# Altium schematic symbol library jlcpcb_2025_04_capacitors_extended_1210.schlib: 709 symbols (part 3 of 4) (continued)
## FM32X223K501ECG
designator C?  Capacitance: 22nF  (hidden comment: *)
Capacitor, Ceramic (MLCC), 22nF, ±10%, 500V, ±10%, SMD 1210; Manufacturer: PSA(Prosperity Dielectrics); Manufacturer Part Number: FM32X223K501ECG; Package Size: 1210; JLCPCB Basic Part: No; JLCPCB Part Number: C976242; Supplier 1: LCSC; Category: Capacitors - MLCC; Supplier Part Number 1: C976242; Tolerance: ±10%; Voltage Rating: 500V; RoHS: Yes; ComponentLink1Description: Datasheet; ComponentLink1URL: https://wmsc.lcsc.com/wmsc/upload/file/pdf/v2/lcsc/2012171208_PSA-Prosperity-Dielectrics-FM32X223K501ECG_C976242.pdf; ComponentLink2Description: JLCPCB Part URL; ComponentLink2URL: https://jlcpcb.com/partdetail/C976242; ComponentLink3Description: LCSC Part URL; ComponentLink3URL: https://lcsc.com/product-detail/Multilayer-Ceramic-Capacitors-MLCC---SMD-SMT_PSAProsperity-Dielectrics-PSAProsperity-Dielectrics-FM32X223K501ECG_C976242.html
footprint CAP-1210 (1210 (3225M) Capacitor)
pins: 1, 2

## FM32X223K501EEG
designator C?  Capacitance: 22nF  (hidden comment: *)
Capacitor, Ceramic (MLCC), 22nF, ±10%, 500V, X7R, ±10%, SMD 1210; Manufacturer: PSA(Prosperity Dielectrics); Manufacturer Part Number: FM32X223K501EEG; Package Size: 1210; JLCPCB Basic Part: No; JLCPCB Part Number: C382221; Supplier 1: LCSC; Category: Capacitors - MLCC; Supplier Part Number 1: C382221; Tolerance: ±10%; Voltage Rating: 500V; Temperature Coefficient: X7R; RoHS: Yes; ComponentLink1Description: Datasheet; ComponentLink1URL: https://wmsc.lcsc.com/wmsc/upload/file/pdf/v2/lcsc/2304140030_PSA-Prosperity-Dielectrics-FM32X223K501EEG_C382221.pdf; ComponentLink2Description: JLCPCB Part URL; ComponentLink2URL: https://jlcpcb.com/partdetail/C382221; ComponentLink3Description: LCSC Part URL; ComponentLink3URL: https://lcsc.com/product-detail/Multilayer-Ceramic-Capacitors-MLCC---SMD-SMT_PSAProsperity-Dielectrics-PSAProsperity-Dielectrics-FM32X223K501EEG_C382221.html
footprint CAP-1210 (1210 (3225M) Capacitor)
pins: 1, 2

## FM32X223K631ECG
designator C?  Capacitance: 22nF  (hidden comment: *)
Capacitor, Ceramic (MLCC), 22nF, ±10%, 630V, X7R, ±10%, SMD 1210; Manufacturer: PSA(Prosperity Dielectrics); Manufacturer Part Number: FM32X223K631ECG; Package Size: 1210; JLCPCB Basic Part: No; JLCPCB Part Number: C692286; Supplier 1: LCSC; Category: Capacitors - MLCC; Supplier Part Number 1: C692286; Tolerance: ±10%; Voltage Rating: 630V; Temperature Coefficient: X7R; RoHS: Yes; ComponentLink1Description: Datasheet; ComponentLink1URL: https://wmsc.lcsc.com/wmsc/upload/file/pdf/v2/lcsc/2304140030_PSA-Prosperity-Dielectrics-FM32X223K631ECG_C692286.pdf; ComponentLink2Description: JLCPCB Part URL; ComponentLink2URL: https://jlcpcb.com/partdetail/C692286; ComponentLink3Description: LCSC Part URL; ComponentLink3URL: https://lcsc.com/product-detail/Multilayer-Ceramic-Capacitors-MLCC---SMD-SMT_PSAProsperity-Dielectrics-PSAProsperity-Dielectrics-FM32X223K631ECG_C692286.html
footprint CAP-1210 (1210 (3225M) Capacitor)
pins: 1, 2

## FM32X223M501ECG
designator C?  Capacitance: 22nF  (hidden comment: *)
Capacitor, Ceramic (MLCC), 22nF, 500V, X7R, SMD 1210; Manufacturer: PSA(Prosperity Dielectrics); Manufacturer Part Number: FM32X223M501ECG; Package Size: 1210; JLCPCB Basic Part: No; JLCPCB Part Number: C2929696; Supplier 1: LCSC; Category: Capacitors - MLCC; Supplier Part Number 1: C2929696; Voltage Rating: 500V; Temperature Coefficient: X7R; RoHS: Yes; ComponentLink1Description: Datasheet; ComponentLink1URL: https://wmsc.lcsc.com/wmsc/upload/file/pdf/v2/lcsc/2203101903_PSA-Prosperity-Dielectrics-FM32X223M501ECG_C2929696.pdf; ComponentLink2Description: JLCPCB Part URL; ComponentLink2URL: https://jlcpcb.com/partdetail/C2929696; ComponentLink3Description: LCSC Part URL; ComponentLink3URL: https://lcsc.com/product-detail/Multilayer-Ceramic-Capacitors-MLCC---SMD-SMT_PSAProsperity-Dielectrics-PSAProsperity-Dielectrics-FM32X223M501ECG_C2929696.html
footprint CAP-1210 (1210 (3225M) Capacitor)
pins: 1, 2

## FM32X224K101ECG
designator C?  Capacitance: 220nF  (hidden comment: *)
Capacitor, Ceramic (MLCC), 220nF, ±10%, 100V, X7R, ±10%, SMD 1210; Manufacturer: PSA(Prosperity Dielectrics); Manufacturer Part Number: FM32X224K101ECG; Package Size: 1210; JLCPCB Basic Part: No; JLCPCB Part Number: C363568; Supplier 1: LCSC; Category: Capacitors - MLCC; Supplier Part Number 1: C363568; Tolerance: ±10%; Voltage Rating: 100V; Temperature Coefficient: X7R; RoHS: Yes; ComponentLink1Description: Datasheet; ComponentLink1URL: https://wmsc.lcsc.com/wmsc/upload/file/pdf/v2/lcsc/2304140030_PSA-Prosperity-Dielectrics-FM32X224K101ECG_C363568.pdf; ComponentLink2Description: JLCPCB Part URL; ComponentLink2URL: https://jlcpcb.com/partdetail/C363568; ComponentLink3Description: LCSC Part URL; ComponentLink3URL: https://lcsc.com/product-detail/Multilayer-Ceramic-Capacitors-MLCC---SMD-SMT_PSAProsperity-Dielectrics-PSAProsperity-Dielectrics-FM32X224K101ECG_C363568.html
footprint CAP-1210 (1210 (3225M) Capacitor)
pins: 1, 2

## FM32X224K251EEG
designator C?  Capacitance: 220nF  (hidden comment: *)
Capacitor, Ceramic (MLCC), 220nF, ±10%, 250V, X7R, ±10%, SMD 1210; Manufacturer: PSA(Prosperity Dielectrics); Manufacturer Part Number: FM32X224K251EEG; Package Size: 1210; JLCPCB Basic Part: No; JLCPCB Part Number: C146177; Supplier 1: LCSC; Category: Capacitors - MLCC; Supplier Part Number 1: C146177; Tolerance: ±10%; Voltage Rating: 250V; Temperature Coefficient: X7R; RoHS: Yes; ComponentLink1Description: Datasheet; ComponentLink1URL: https://wmsc.lcsc.com/wmsc/upload/file/pdf/v2/lcsc/2304140030_PSA-Prosperity-Dielectrics-FM32X224K251EEG_C146177.pdf; ComponentLink2Description: JLCPCB Part URL; ComponentLink2URL: https://jlcpcb.com/partdetail/C146177; ComponentLink3Description: LCSC Part URL; ComponentLink3URL: https://lcsc.com/product-detail/Multilayer-Ceramic-Capacitors-MLCC---SMD-SMT_PSAProsperity-Dielectrics-PSAProsperity-Dielectrics-FM32X224K251EEG_C146177.html
footprint CAP-1210 (1210 (3225M) Capacitor)
pins: 1, 2

## FM32X224K251EGG
designator C?  Capacitance: 220nF  (hidden comment: *)
Capacitor, Ceramic (MLCC), 220nF, ±10%, 250V, ±10%, SMD 1210; Manufacturer: PSA(Prosperity Dielectrics); Manufacturer Part Number: FM32X224K251EGG; Package Size: 1210; JLCPCB Basic Part: No; JLCPCB Part Number: C2843408; Supplier 1: LCSC; Category: Capacitors - MLCC; Supplier Part Number 1: C2843408; Tolerance: ±10%; Voltage Rating: 250V; RoHS: Yes; ComponentLink1Description: Datasheet; ComponentLink1URL: https://wmsc.lcsc.com/wmsc/upload/file/pdf/v2/lcsc/2108072030_PSA-Prosperity-Dielectrics-FM32X224K251EGG_C2843408.pdf; ComponentLink2Description: JLCPCB Part URL; ComponentLink2URL: https://jlcpcb.com/partdetail/C2843408; ComponentLink3Description: LCSC Part URL; ComponentLink3URL: https://lcsc.com/product-detail/Multilayer-Ceramic-Capacitors-MLCC---SMD-SMT_PSAProsperity-Dielectrics-PSAProsperity-Dielectrics-FM32X224K251EGG_C2843408.html
footprint CAP-1210 (1210 (3225M) Capacitor)
pins: 1, 2

## FM32X273K101EMG
designator C?  Capacitance: 27nF  (hidden comment: *)
Capacitor, Ceramic (MLCC), 27nF, ±10%, 100V, X7R, ±10%, SMD 1210; Manufacturer: PSA(Prosperity Dielectrics); Manufacturer Part Number: FM32X273K101EMG; Package Size: 1210; JLCPCB Basic Part: No; JLCPCB Part Number: C525188; Supplier 1: LCSC; Category: Capacitors - MLCC; Supplier Part Number 1: C525188; Tolerance: ±10%; Voltage Rating: 100V; Temperature Coefficient: X7R; RoHS: Yes; ComponentLink1Description: Datasheet; ComponentLink1URL: https://wmsc.lcsc.com/wmsc/upload/file/pdf/v2/lcsc/2304140030_PSA-Prosperity-Dielectrics-FM32X273K101EMG_C525188.pdf; ComponentLink2Description: JLCPCB Part URL; ComponentLink2URL: https://jlcpcb.com/partdetail/C525188; ComponentLink3Description: LCSC Part URL; ComponentLink3URL: https://lcsc.com/product-detail/Multilayer-Ceramic-Capacitors-MLCC---SMD-SMT_PSAProsperity-Dielectrics-PSAProsperity-Dielectrics-FM32X273K101EMG_C525188.html
footprint CAP-1210 (1210 (3225M) Capacitor)
pins: 1, 2

## FM32X333K631EEG
designator C?  Capacitance: 33nF  (hidden comment: *)
Capacitor, Ceramic (MLCC), 33nF, ±10%, 630V, X7R, ±10%, SMD 1210; Manufacturer: PSA(Prosperity Dielectrics); Manufacturer Part Number: FM32X333K631EEG; Package Size: 1210; JLCPCB Basic Part: No; JLCPCB Part Number: C382220; Supplier 1: LCSC; Category: Capacitors - MLCC; Supplier Part Number 1: C382220; Tolerance: ±10%; Voltage Rating: 630V; Temperature Coefficient: X7R; RoHS: Yes; ComponentLink1Description: Datasheet; ComponentLink1URL: https://wmsc.lcsc.com/wmsc/upload/file/pdf/v2/lcsc/2304140030_PSA-Prosperity-Dielectrics-FM32X333K631EEG_C382220.pdf; ComponentLink2Description: JLCPCB Part URL; ComponentLink2URL: https://jlcpcb.com/partdetail/C382220; ComponentLink3Description: LCSC Part URL; ComponentLink3URL: https://lcsc.com/product-detail/Multilayer-Ceramic-Capacitors-MLCC---SMD-SMT_PSAProsperity-Dielectrics-PSAProsperity-Dielectrics-FM32X333K631EEG_C382220.html
footprint CAP-1210 (1210 (3225M) Capacitor)
pins: 1, 2

## FM32X334K101EEG
designator C?  Capacitance: 330nF  (hidden comment: *)
Capacitor, Ceramic (MLCC), 330nF, 100V, X7R, SMD 1210; Manufacturer: PSA(Prosperity Dielectrics); Manufacturer Part Number: FM32X334K101EEG; Package Size: 1210; JLCPCB Basic Part: No; JLCPCB Part Number: C2915731; Supplier 1: LCSC; Category: Capacitors - MLCC; Supplier Part Number 1: C2915731; Voltage Rating: 100V; Temperature Coefficient: X7R; RoHS: Yes; ComponentLink1Description: Datasheet; ComponentLink1URL: https://wmsc.lcsc.com/wmsc/upload/file/pdf/v2/lcsc/2111161830_PSA-Prosperity-Dielectrics-FM32X334K101EEG_C2915731.pdf; ComponentLink2Description: JLCPCB Part URL; ComponentLink2URL: https://jlcpcb.com/partdetail/C2915731; ComponentLink3Description: LCSC Part URL; ComponentLink3URL: https://lcsc.com/product-detail/Multilayer-Ceramic-Capacitors-MLCC---SMD-SMT_PSAProsperity-Dielectrics-PSAProsperity-Dielectrics-FM32X334K101EEG_C2915731.html
footprint CAP-1210 (1210 (3225M) Capacitor)
pins: 1, 2

## FM32X473K251ECG
designator C?  Capacitance: 47nF  (hidden comment: *)
Capacitor, Ceramic (MLCC), 47nF, ±10%, 250V, X7R, ±10%, SMD 1210; Manufacturer: PSA(Prosperity Dielectrics); Manufacturer Part Number: FM32X473K251ECG; Package Size: 1210; JLCPCB Basic Part: No; JLCPCB Part Number: C779501; Supplier 1: LCSC; Category: Capacitors - MLCC; Supplier Part Number 1: C779501; Tolerance: ±10%; Voltage Rating: 250V; Temperature Coefficient: X7R; RoHS: Yes; ComponentLink1Description: Datasheet; ComponentLink1URL: https://wmsc.lcsc.com/wmsc/upload/file/pdf/v2/lcsc/2009031038_PSA-Prosperity-Dielectrics-FM32X473K251ECG_C779501.pdf; ComponentLink2Description: JLCPCB Part URL; ComponentLink2URL: https://jlcpcb.com/partdetail/C779501; ComponentLink3Description: LCSC Part URL; ComponentLink3URL: https://lcsc.com/product-detail/Multilayer-Ceramic-Capacitors-MLCC---SMD-SMT_PSAProsperity-Dielectrics-PSAProsperity-Dielectrics-FM32X473K251ECG_C779501.html
footprint CAP-1210 (1210 (3225M) Capacitor)
pins: 1, 2

## FM32X473K631EEG
designator C?  Capacitance: 47nF  (hidden comment: *)
Capacitor, Ceramic (MLCC), 47nF, ±10%, 630V, X7R, ±10%, SMD 1210; Manufacturer: PSA(Prosperity Dielectrics); Manufacturer Part Number: FM32X473K631EEG; Package Size: 1210; JLCPCB Basic Part: No; JLCPCB Part Number: C692292; Supplier 1: LCSC; Category: Capacitors - MLCC; Supplier Part Number 1: C692292; Tolerance: ±10%; Voltage Rating: 630V; Temperature Coefficient: X7R; RoHS: Yes; ComponentLink1Description: Datasheet; ComponentLink1URL: https://wmsc.lcsc.com/wmsc/upload/file/pdf/v2/lcsc/2304140030_PSA-Prosperity-Dielectrics-FM32X473K631EEG_C692292.pdf; ComponentLink2Description: JLCPCB Part URL; ComponentLink2URL: https://jlcpcb.com/partdetail/C692292; ComponentLink3Description: LCSC Part URL; ComponentLink3URL: https://lcsc.com/product-detail/Multilayer-Ceramic-Capacitors-MLCC---SMD-SMT_PSAProsperity-Dielectrics-PSAProsperity-Dielectrics-FM32X473K631EEG_C692292.html
footprint CAP-1210 (1210 (3225M) Capacitor)
pins: 1, 2

## FM32X474K101EEG
designator C?  Capacitance: 470nF  (hidden comment: *)
Capacitor, Ceramic (MLCC), 470nF, ±10%, 100V, X7R, ±10%, SMD 1210; Manufacturer: PSA(Prosperity Dielectrics); Manufacturer Part Number: FM32X474K101EEG; Package Size: 1210; JLCPCB Basic Part: No; JLCPCB Part Number: C382219; Supplier 1: LCSC; Category: Capacitors - MLCC; Supplier Part Number 1: C382219; Tolerance: ±10%; Voltage Rating: 100V; Temperature Coefficient: X7R; RoHS: Yes; ComponentLink1Description: Datasheet; ComponentLink1URL: https://wmsc.lcsc.com/wmsc/upload/file/pdf/v2/lcsc/2304140030_PSA-Prosperity-Dielectrics-FM32X474K101EEG_C382219.pdf; ComponentLink2Description: JLCPCB Part URL; ComponentLink2URL: https://jlcpcb.com/partdetail/C382219; ComponentLink3Description: LCSC Part URL; ComponentLink3URL: https://lcsc.com/product-detail/Multilayer-Ceramic-Capacitors-MLCC---SMD-SMT_PSAProsperity-Dielectrics-PSAProsperity-Dielectrics-FM32X474K101EEG_C382219.html
footprint CAP-1210 (1210 (3225M) Capacitor)
pins: 1, 2

## FM32X474K101EGG
designator C?  Capacitance: 470nF  (hidden comment: *)
Capacitor, Ceramic (MLCC), 470nF, ±10%, 100V, X7R, ±10%, SMD 1210; Manufacturer: PSA(Prosperity Dielectrics); Manufacturer Part Number: FM32X474K101EGG; Package Size: 1210; JLCPCB Basic Part: No; JLCPCB Part Number: C2847452; Supplier 1: LCSC; Category: Capacitors - MLCC; Supplier Part Number 1: C2847452; Tolerance: ±10%; Voltage Rating: 100V; Temperature Coefficient: X7R; RoHS: Yes; ComponentLink1Description: Datasheet; ComponentLink1URL: https://wmsc.lcsc.com/wmsc/upload/file/pdf/v2/lcsc/2108142230_PSA-Prosperity-Dielectrics-FM32X474K101EGG_C2847452.pdf; ComponentLink2Description: JLCPCB Part URL; ComponentLink2URL: https://jlcpcb.com/partdetail/C2847452; ComponentLink3Description: LCSC Part URL; ComponentLink3URL: https://lcsc.com/product-detail/Multilayer-Ceramic-Capacitors-MLCC---SMD-SMT_PSAProsperity-Dielectrics-PSAProsperity-Dielectrics-FM32X474K101EGG_C2847452.html
footprint CAP-1210 (1210 (3225M) Capacitor)
pins: 1, 2

## FM32X474K201EGG
designator C?  Capacitance: 470nF  (hidden comment: *)
Capacitor, Ceramic (MLCC), 470nF, ±10%, 200V, X7R, ±10%, SMD 1210; Manufacturer: PSA(Prosperity Dielectrics); Manufacturer Part Number: FM32X474K201EGG; Package Size: 1210; JLCPCB Basic Part: No; JLCPCB Part Number: C394156; Supplier 1: LCSC; Category: Capacitors - MLCC; Supplier Part Number 1: C394156; Tolerance: ±10%; Voltage Rating: 200V; Temperature Coefficient: X7R; RoHS: Yes; ComponentLink1Description: Datasheet; ComponentLink1URL: https://wmsc.lcsc.com/wmsc/upload/file/pdf/v2/lcsc/2304140030_PSA-Prosperity-Dielectrics-FM32X474K201EGG_C394156.pdf; ComponentLink2Description: JLCPCB Part URL; ComponentLink2URL: https://jlcpcb.com/partdetail/C394156; ComponentLink3Description: LCSC Part URL; ComponentLink3URL: https://lcsc.com/product-detail/Multilayer-Ceramic-Capacitors-MLCC---SMD-SMT_PSAProsperity-Dielectrics-PSAProsperity-Dielectrics-FM32X474K201EGG_C394156.html
footprint CAP-1210 (1210 (3225M) Capacitor)
pins: 1, 2

## FM32X474K251EGG
designator C?  Capacitance: 470nF  (hidden comment: *)
Capacitor, Ceramic (MLCC), 470nF, ±10%, 250V, X7R, ±10%, SMD 1210; Manufacturer: PSA(Prosperity Dielectrics); Manufacturer Part Number: FM32X474K251EGG; Package Size: 1210; JLCPCB Basic Part: No; JLCPCB Part Number: C192761; Supplier 1: LCSC; Category: Capacitors - MLCC; Supplier Part Number 1: C192761; Tolerance: ±10%; Voltage Rating: 250V; Temperature Coefficient: X7R; RoHS: Yes; ComponentLink1Description: Datasheet; ComponentLink1URL: https://wmsc.lcsc.com/wmsc/upload/file/pdf/v2/lcsc/2304140030_PSA-Prosperity-Dielectrics-FM32X474K251EGG_C192761.pdf; ComponentLink2Description: JLCPCB Part URL; ComponentLink2URL: https://jlcpcb.com/partdetail/C192761; ComponentLink3Description: LCSC Part URL; ComponentLink3URL: https://lcsc.com/product-detail/Multilayer-Ceramic-Capacitors-MLCC---SMD-SMT_PSAProsperity-Dielectrics-PSAProsperity-Dielectrics-FM32X474K251EGG_C192761.html
footprint CAP-1210 (1210 (3225M) Capacitor)
pins: 1, 2

## FM32X563K631EEG
designator C?  Capacitance: 56nF  (hidden comment: *)
Capacitor, Ceramic (MLCC), 56nF, ±10%, 630V, X7R, ±10%, SMD 1210; Manufacturer: PSA(Prosperity Dielectrics); Manufacturer Part Number: FM32X563K631EEG; Package Size: 1210; JLCPCB Basic Part: No; JLCPCB Part Number: C382218; Supplier 1: LCSC; Category: Capacitors - MLCC; Supplier Part Number 1: C382218; Tolerance: ±10%; Voltage Rating: 630V; Temperature Coefficient: X7R; RoHS: Yes; ComponentLink1Description: Datasheet; ComponentLink1URL: https://wmsc.lcsc.com/wmsc/upload/file/pdf/v2/lcsc/2304140030_PSA-Prosperity-Dielectrics-FM32X563K631EEG_C382218.pdf; ComponentLink2Description: JLCPCB Part URL; ComponentLink2URL: https://jlcpcb.com/partdetail/C382218; ComponentLink3Description: LCSC Part URL; ComponentLink3URL: https://lcsc.com/product-detail/Multilayer-Ceramic-Capacitors-MLCC---SMD-SMT_PSAProsperity-Dielectrics-PSAProsperity-Dielectrics-FM32X563K631EEG_C382218.html
footprint CAP-1210 (1210 (3225M) Capacitor)
pins: 1, 2

## FM32X683K501EFG
designator C?  Capacitance: 68nF  (hidden comment: *)
Capacitor, Ceramic (MLCC), 68nF, ±10%, 500V, X7R, ±10%, SMD 1210; Manufacturer: PSA(Prosperity Dielectrics); Manufacturer Part Number: FM32X683K501EFG; Package Size: 1210; JLCPCB Basic Part: No; JLCPCB Part Number: C146178; Supplier 1: LCSC; Category: Capacitors - MLCC; Supplier Part Number 1: C146178; Tolerance: ±10%; Voltage Rating: 500V; Temperature Coefficient: X7R; RoHS: Yes; ComponentLink1Description: Datasheet; ComponentLink1URL: https://wmsc.lcsc.com/wmsc/upload/file/pdf/v2/lcsc/2304140030_PSA-Prosperity-Dielectrics-FM32X683K501EFG_C146178.pdf; ComponentLink2Description: JLCPCB Part URL; ComponentLink2URL: https://jlcpcb.com/partdetail/C146178; ComponentLink3Description: LCSC Part URL; ComponentLink3URL: https://lcsc.com/product-detail/Multilayer-Ceramic-Capacitors-MLCC---SMD-SMT_PSAProsperity-Dielectrics-PSAProsperity-Dielectrics-FM32X683K501EFG_C146178.html
footprint CAP-1210 (1210 (3225M) Capacitor)
pins: 1, 2

## FM32X683K631EFG
designator C?  Capacitance: 68nF  (hidden comment: *)
Capacitor, Ceramic (MLCC), 68nF, ±10%, 630V, X7R, ±10%, SMD 1210; Manufacturer: PSA(Prosperity Dielectrics); Manufacturer Part Number: FM32X683K631EFG; Package Size: 1210; JLCPCB Basic Part: No; JLCPCB Part Number: C692293; Supplier 1: LCSC; Category: Capacitors - MLCC; Supplier Part Number 1: C692293; Tolerance: ±10%; Voltage Rating: 630V; Temperature Coefficient: X7R; RoHS: Yes; ComponentLink1Description: Datasheet; ComponentLink1URL: https://wmsc.lcsc.com/wmsc/upload/file/pdf/v2/lcsc/2304140030_PSA-Prosperity-Dielectrics-FM32X683K631EFG_C692293.pdf; ComponentLink2Description: JLCPCB Part URL; ComponentLink2URL: https://jlcpcb.com/partdetail/C692293; ComponentLink3Description: LCSC Part URL; ComponentLink3URL: https://lcsc.com/product-detail/Multilayer-Ceramic-Capacitors-MLCC---SMD-SMT_PSAProsperity-Dielectrics-PSAProsperity-Dielectrics-FM32X683K631EFG_C692293.html
footprint CAP-1210 (1210 (3225M) Capacitor)
pins: 1, 2

## FM32X684K101EFG
designator C?  Capacitance: 680nF  (hidden comment: *)
Capacitor, Ceramic (MLCC), 680nF, ±10%, 100V, X7R, ±10%, SMD 1210; Manufacturer: PSA(Prosperity Dielectrics); Manufacturer Part Number: FM32X684K101EFG; Package Size: 1210; JLCPCB Basic Part: No; JLCPCB Part Number: C692308; Supplier 1: LCSC; Category: Capacitors - MLCC; Supplier Part Number 1: C692308; Tolerance: ±10%; Voltage Rating: 100V; Temperature Coefficient: X7R; RoHS: Yes; ComponentLink1Description: Datasheet; ComponentLink1URL: https://wmsc.lcsc.com/wmsc/upload/file/pdf/v2/lcsc/2304140030_PSA-Prosperity-Dielectrics-FM32X684K101EFG_C692308.pdf; ComponentLink2Description: JLCPCB Part URL; ComponentLink2URL: https://jlcpcb.com/partdetail/C692308; ComponentLink3Description: LCSC Part URL; ComponentLink3URL: https://lcsc.com/product-detail/Multilayer-Ceramic-Capacitors-MLCC---SMD-SMT_PSAProsperity-Dielectrics-PSAProsperity-Dielectrics-FM32X684K101EFG_C692308.html
footprint CAP-1210 (1210 (3225M) Capacitor)
pins: 1, 2

## FM32X684K251EGG
designator C?  Capacitance: 680nF  (hidden comment: *)
Capacitor, Ceramic (MLCC), 680nF, ±10%, 250V, X7R, ±10%, SMD 1210; Manufacturer: PSA(Prosperity Dielectrics); Manufacturer Part Number: FM32X684K251EGG; Package Size: 1210; JLCPCB Basic Part: No; JLCPCB Part Number: C692307; Supplier 1: LCSC; Category: Capacitors - MLCC; Supplier Part Number 1: C692307; Tolerance: ±10%; Voltage Rating: 250V; Temperature Coefficient: X7R; RoHS: Yes; ComponentLink1Description: Datasheet; ComponentLink1URL: https://wmsc.lcsc.com/wmsc/upload/file/pdf/v2/lcsc/2304140030_PSA-Prosperity-Dielectrics-FM32X684K251EGG_C692307.pdf; ComponentLink2Description: JLCPCB Part URL; ComponentLink2URL: https://jlcpcb.com/partdetail/C692307; ComponentLink3Description: LCSC Part URL; ComponentLink3URL: https://lcsc.com/product-detail/Multilayer-Ceramic-Capacitors-MLCC---SMD-SMT_PSAProsperity-Dielectrics-PSAProsperity-Dielectrics-FM32X684K251EGG_C692307.html
footprint CAP-1210 (1210 (3225M) Capacitor)
pins: 1, 2

## FS32B106K160EFG
designator C?  Capacitance: 10uF  (hidden comment: *)
Capacitor, Ceramic (MLCC), 10uF, ±10%, 16V, X5R, ±10%, SMD 1210; Manufacturer: PSA(Prosperity Dielectrics); Manufacturer Part Number: FS32B106K160EFG; Package Size: 1210; JLCPCB Basic Part: No; JLCPCB Part Number: C525353; Supplier 1: LCSC; Category: Capacitors - MLCC; Supplier Part Number 1: C525353; Tolerance: ±10%; Voltage Rating: 16V; Temperature Coefficient: X5R; RoHS: Yes; ComponentLink1Description: Datasheet; ComponentLink1URL: https://wmsc.lcsc.com/wmsc/upload/file/pdf/v2/lcsc/2304140030_PSA-Prosperity-Dielectrics-FS32B106K160EFG_C525353.pdf; ComponentLink2Description: JLCPCB Part URL; ComponentLink2URL: https://jlcpcb.com/partdetail/C525353; ComponentLink3Description: LCSC Part URL; ComponentLink3URL: https://lcsc.com/product-detail/Multilayer-Ceramic-Capacitors-MLCC---SMD-SMT_PSAProsperity-Dielectrics-PSAProsperity-Dielectrics-FS32B106K160EFG_C525353.html
footprint CAP-1210 (1210 (3225M) Capacitor)
pins: 1, 2

## FS32X105K101EFG
designator C?  Capacitance: 1uF  (hidden comment: *)
Capacitor, Ceramic (MLCC), 1uF, ±10%, 100V, X7R, ±10%, SMD 1210; Manufacturer: PSA(Prosperity Dielectrics); Manufacturer Part Number: FS32X105K101EFG; Package Size: 1210; JLCPCB Basic Part: No; JLCPCB Part Number: C382212; Supplier 1: LCSC; Category: Capacitors - MLCC; Supplier Part Number 1: C382212; Tolerance: ±10%; Voltage Rating: 100V; Temperature Coefficient: X7R; RoHS: Yes; ComponentLink1Description: Datasheet; ComponentLink1URL: https://wmsc.lcsc.com/wmsc/upload/file/pdf/v2/lcsc/2304140030_PSA-Prosperity-Dielectrics-FS32X105K101EFG_C382212.pdf; ComponentLink2Description: JLCPCB Part URL; ComponentLink2URL: https://jlcpcb.com/partdetail/C382212; ComponentLink3Description: LCSC Part URL; ComponentLink3URL: https://lcsc.com/product-detail/Multilayer-Ceramic-Capacitors-MLCC---SMD-SMT_PSAProsperity-Dielectrics-PSAProsperity-Dielectrics-FS32X105K101EFG_C382212.html
footprint CAP-1210 (1210 (3225M) Capacitor)
pins: 1, 2

## FS32X105K500EFG
designator C?  Capacitance: 1uF  (hidden comment: *)
Capacitor, Ceramic (MLCC), 1uF, ±10%, 50V, ±10%, SMD 1210; Manufacturer: PSA(Prosperity Dielectrics); Manufacturer Part Number: FS32X105K500EFG; Package Size: 1210; JLCPCB Basic Part: No; JLCPCB Part Number: C1021611; Supplier 1: LCSC; Category: Capacitors - MLCC; Supplier Part Number 1: C1021611; Tolerance: ±10%; Voltage Rating: 50V; RoHS: Yes; ComponentLink1Description: Datasheet; ComponentLink1URL: https://wmsc.lcsc.com/wmsc/upload/file/pdf/v2/lcsc/2304140030_PSA-Prosperity-Dielectrics-FS32X105K500EFG_C1021611.pdf; ComponentLink2Description: JLCPCB Part URL; ComponentLink2URL: https://jlcpcb.com/partdetail/C1021611; ComponentLink3Description: LCSC Part URL; ComponentLink3URL: https://lcsc.com/product-detail/Multilayer-Ceramic-Capacitors-MLCC---SMD-SMT_PSAProsperity-Dielectrics-PSAProsperity-Dielectrics-FS32X105K500EFG_C1021611.html
footprint CAP-1210 (1210 (3225M) Capacitor)
pins: 1, 2

## FS32X106K101EGG
designator C?  Capacitance: 10uF  (hidden comment: *)
Capacitor, Ceramic (MLCC), 10uF, ±10%, 100V, X7R, ±10%, SMD 1210; Manufacturer: PSA(Prosperity Dielectrics); Manufacturer Part Number: FS32X106K101EGG; Package Size: 1210; JLCPCB Basic Part: No; JLCPCB Part Number: C5156756; Supplier 1: LCSC; Category: Capacitors - MLCC; Supplier Part Number 1: C5156756; Tolerance: ±10%; Voltage Rating: 100V; Temperature Coefficient: X7R; RoHS: Yes; ComponentLink1Description: Datasheet; ComponentLink1URL: https://wmsc.lcsc.com/wmsc/upload/file/pdf/v2/lcsc/2209061730_PSA-Prosperity-Dielectrics-FS32X106K101EGG_C5156756.pdf; ComponentLink2Description: JLCPCB Part URL; ComponentLink2URL: https://jlcpcb.com/partdetail/C5156756; ComponentLink3Description: LCSC Part URL; ComponentLink3URL: https://lcsc.com/product-detail/Multilayer-Ceramic-Capacitors-MLCC---SMD-SMT_PSAProsperity-Dielectrics-PSAProsperity-Dielectrics-FS32X106K101EGG_C5156756.html
footprint CAP-1210 (1210 (3225M) Capacitor)
pins: 1, 2

## FS32X106K500EGG
designator C?  Capacitance: 10uF  (hidden comment: *)
Capacitor, Ceramic (MLCC), 10uF, ±10%, 50V, X7R, ±10%, SMD 1210; Manufacturer: PSA(Prosperity Dielectrics); Manufacturer Part Number: FS32X106K500EGG; Package Size: 1210; JLCPCB Basic Part: No; JLCPCB Part Number: C381467; Supplier 1: LCSC; Category: Capacitors - MLCC; Supplier Part Number 1: C381467; Tolerance: ±10%; Voltage Rating: 50V; Temperature Coefficient: X7R; RoHS: Yes; ComponentLink1Description: Datasheet; ComponentLink1URL: https://wmsc.lcsc.com/wmsc/upload/file/pdf/v2/lcsc/2304140030_PSA-Prosperity-Dielectrics-FS32X106K500EGG_C381467.pdf; ComponentLink2Description: JLCPCB Part URL; ComponentLink2URL: https://jlcpcb.com/partdetail/C381467; ComponentLink3Description: LCSC Part URL; ComponentLink3URL: https://lcsc.com/product-detail/Multilayer-Ceramic-Capacitors-MLCC---SMD-SMT_PSAProsperity-Dielectrics-PSAProsperity-Dielectrics-FS32X106K500EGG_C381467.html
footprint CAP-1210 (1210 (3225M) Capacitor)
pins: 1, 2

## FS32X225K101EGG
designator C?  Capacitance: 2.2uF  (hidden comment: *)
Capacitor, Ceramic (MLCC), 2.2uF, ±10%, 100V, X7R, ±10%, SMD 1210; Manufacturer: PSA(Prosperity Dielectrics); Manufacturer Part Number: FS32X225K101EGG; Package Size: 1210; JLCPCB Basic Part: No; JLCPCB Part Number: C153036; Supplier 1: LCSC; Category: Capacitors - MLCC; Supplier Part Number 1: C153036; Tolerance: ±10%; Voltage Rating: 100V; Temperature Coefficient: X7R; RoHS: Yes; ComponentLink1Description: Datasheet; ComponentLink1URL: https://wmsc.lcsc.com/wmsc/upload/file/pdf/v2/lcsc/2304140030_PSA-Prosperity-Dielectrics-FS32X225K101EGG_C153036.pdf; ComponentLink2Description: JLCPCB Part URL; ComponentLink2URL: https://jlcpcb.com/partdetail/C153036; ComponentLink3Description: LCSC Part URL; ComponentLink3URL: https://lcsc.com/product-detail/Multilayer-Ceramic-Capacitors-MLCC---SMD-SMT_PSAProsperity-Dielectrics-PSAProsperity-Dielectrics-FS32X225K101EGG_C153036.html
footprint CAP-1210 (1210 (3225M) Capacitor)
pins: 1, 2

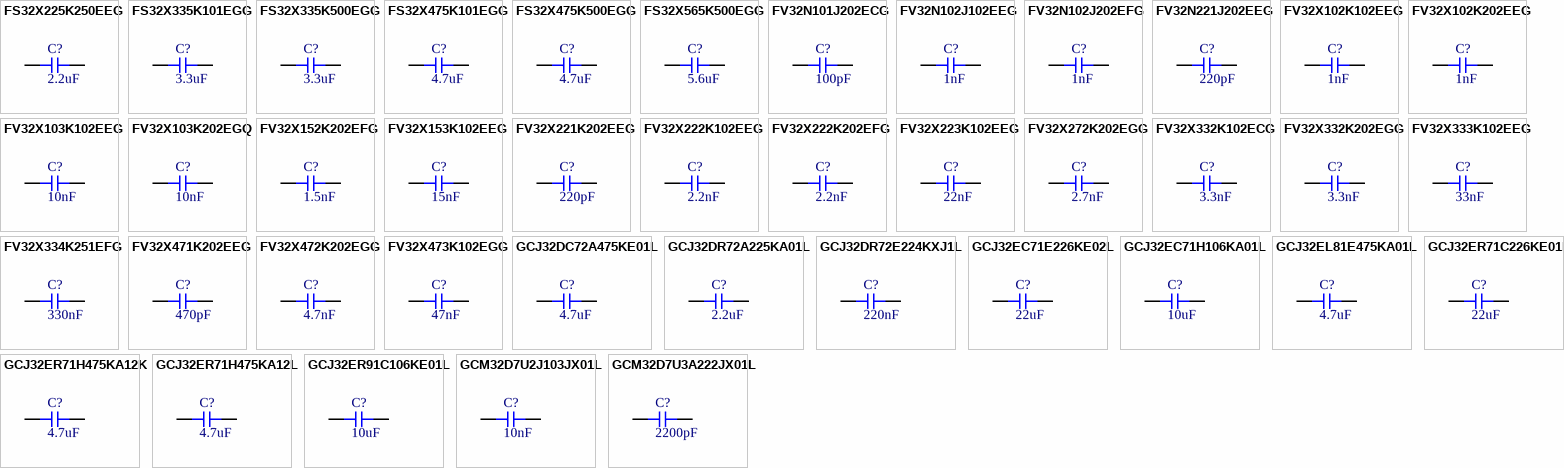
[diagram p12: symbols FS32X225K250EEG to GCM32D7U3A222JX01L]

## FS32X225K250EEG
designator C?  Capacitance: 2.2uF  (hidden comment: *)
Capacitor, Ceramic (MLCC), 2.2uF, 25V, X7R, SMD 1210; Manufacturer: Walsin Tech Corp; Manufacturer Part Number: FS32X225K250EEG; Package Size: 1210; JLCPCB Basic Part: No; JLCPCB Part Number: C2909490; Supplier 1: LCSC; Category: Capacitors - MLCC; Supplier Part Number 1: C2909490; Voltage Rating: 25V; Temperature Coefficient: X7R; RoHS: Yes; ComponentLink1Description: Datasheet; ComponentLink1URL: https://wmsc.lcsc.com/wmsc/upload/file/pdf/v2/lcsc/2405111026_PSA-Prosperity-Dielectrics-FS32X225K250EEG_C2909490.pdf; ComponentLink2Description: JLCPCB Part URL; ComponentLink2URL: https://jlcpcb.com/partdetail/C2909490; ComponentLink3Description: LCSC Part URL; ComponentLink3URL: https://lcsc.com/product-detail/Multilayer-Ceramic-Capacitors-MLCC---SMD-SMT_Walsin-Tech-Corp-Walsin-Tech-Corp-FS32X225K250EEG_C2909490.html
footprint CAP-1210 (1210 (3225M) Capacitor)
pins: 1, 2

## FS32X335K101EGG
designator C?  Capacitance: 3.3uF  (hidden comment: *)
Capacitor, Ceramic (MLCC), 3.3uF, ±10%, 100V, X7R, ±10%, SMD 1210; Manufacturer: PSA(Prosperity Dielectrics); Manufacturer Part Number: FS32X335K101EGG; Package Size: 1210; JLCPCB Basic Part: No; JLCPCB Part Number: C692313; Supplier 1: LCSC; Category: Capacitors - MLCC; Supplier Part Number 1: C692313; Tolerance: ±10%; Voltage Rating: 100V; Temperature Coefficient: X7R; RoHS: Yes; ComponentLink1Description: Datasheet; ComponentLink1URL: https://wmsc.lcsc.com/wmsc/upload/file/pdf/v2/lcsc/2304140030_PSA-Prosperity-Dielectrics-FS32X335K101EGG_C692313.pdf; ComponentLink2Description: JLCPCB Part URL; ComponentLink2URL: https://jlcpcb.com/partdetail/C692313; ComponentLink3Description: LCSC Part URL; ComponentLink3URL: https://lcsc.com/product-detail/Multilayer-Ceramic-Capacitors-MLCC---SMD-SMT_PSAProsperity-Dielectrics-PSAProsperity-Dielectrics-FS32X335K101EGG_C692313.html
footprint CAP-1210 (1210 (3225M) Capacitor)
pins: 1, 2

## FS32X335K500EGG
designator C?  Capacitance: 3.3uF  (hidden comment: *)
Capacitor, Ceramic (MLCC), 3.3uF, ±10%, 50V, ±10%, SMD 1210; Manufacturer: PSA(Prosperity Dielectrics); Manufacturer Part Number: FS32X335K500EGG; Package Size: 1210; JLCPCB Basic Part: No; JLCPCB Part Number: C1021610; Supplier 1: LCSC; Category: Capacitors - MLCC; Supplier Part Number 1: C1021610; Tolerance: ±10%; Voltage Rating: 50V; RoHS: Yes; ComponentLink1Description: Datasheet; ComponentLink1URL: https://wmsc.lcsc.com/wmsc/upload/file/pdf/v2/lcsc/2304140030_PSA-Prosperity-Dielectrics-FS32X335K500EGG_C1021610.pdf; ComponentLink2Description: JLCPCB Part URL; ComponentLink2URL: https://jlcpcb.com/partdetail/C1021610; ComponentLink3Description: LCSC Part URL; ComponentLink3URL: https://lcsc.com/product-detail/Multilayer-Ceramic-Capacitors-MLCC---SMD-SMT_PSAProsperity-Dielectrics-PSAProsperity-Dielectrics-FS32X335K500EGG_C1021610.html
footprint CAP-1210 (1210 (3225M) Capacitor)
pins: 1, 2

## FS32X475K101EGG
designator C?  Capacitance: 4.7uF  (hidden comment: *)
Capacitor, Ceramic (MLCC), 4.7uF, ±10%, 100V, X7R, ±10%, SMD 1210; Manufacturer: PSA(Prosperity Dielectrics); Manufacturer Part Number: FS32X475K101EGG; Package Size: 1210; JLCPCB Basic Part: No; JLCPCB Part Number: C381466; Supplier 1: LCSC; Category: Capacitors - MLCC; Supplier Part Number 1: C381466; Tolerance: ±10%; Voltage Rating: 100V; Temperature Coefficient: X7R; RoHS: Yes; ComponentLink1Description: Datasheet; ComponentLink1URL: https://wmsc.lcsc.com/wmsc/upload/file/pdf/v2/lcsc/2304140030_PSA-Prosperity-Dielectrics-FS32X475K101EGG_C381466.pdf; ComponentLink2Description: JLCPCB Part URL; ComponentLink2URL: https://jlcpcb.com/partdetail/C381466; ComponentLink3Description: LCSC Part URL; ComponentLink3URL: https://lcsc.com/product-detail/Multilayer-Ceramic-Capacitors-MLCC---SMD-SMT_PSAProsperity-Dielectrics-PSAProsperity-Dielectrics-FS32X475K101EGG_C381466.html
footprint CAP-1210 (1210 (3225M) Capacitor)
pins: 1, 2

## FS32X475K500EGG
designator C?  Capacitance: 4.7uF  (hidden comment: *)
Capacitor, Ceramic (MLCC), 4.7uF, ±10%, 50V, X7R, ±10%, SMD 1210; Manufacturer: PSA(Prosperity Dielectrics); Manufacturer Part Number: FS32X475K500EGG; Package Size: 1210; JLCPCB Basic Part: No; JLCPCB Part Number: C381465; Supplier 1: LCSC; Category: Capacitors - MLCC; Supplier Part Number 1: C381465; Tolerance: ±10%; Voltage Rating: 50V; Temperature Coefficient: X7R; RoHS: Yes; ComponentLink1Description: Datasheet; ComponentLink1URL: https://wmsc.lcsc.com/wmsc/upload/file/pdf/v2/lcsc/2304140030_PSA-Prosperity-Dielectrics-FS32X475K500EGG_C381465.pdf; ComponentLink2Description: JLCPCB Part URL; ComponentLink2URL: https://jlcpcb.com/partdetail/C381465; ComponentLink3Description: LCSC Part URL; ComponentLink3URL: https://lcsc.com/product-detail/Multilayer-Ceramic-Capacitors-MLCC---SMD-SMT_PSAProsperity-Dielectrics-PSAProsperity-Dielectrics-FS32X475K500EGG_C381465.html
footprint CAP-1210 (1210 (3225M) Capacitor)
pins: 1, 2

## FS32X565K500EGG
designator C?  Capacitance: 5.6uF  (hidden comment: *)
Capacitor, Ceramic (MLCC), 5.6uF, ±10%, 50V, X7R, ±10%, SMD 1210; Manufacturer: PSA(Prosperity Dielectrics); Manufacturer Part Number: FS32X565K500EGG; Package Size: 1210; JLCPCB Basic Part: No; JLCPCB Part Number: C5156763; Supplier 1: LCSC; Category: Capacitors - MLCC; Supplier Part Number 1: C5156763; Tolerance: ±10%; Voltage Rating: 50V; Temperature Coefficient: X7R; RoHS: Yes; ComponentLink1Description: Datasheet; ComponentLink1URL: https://wmsc.lcsc.com/wmsc/upload/file/pdf/v2/lcsc/2209061730_PSA-Prosperity-Dielectrics-FS32X565K500EGG_C5156763.pdf; ComponentLink2Description: JLCPCB Part URL; ComponentLink2URL: https://jlcpcb.com/partdetail/C5156763; ComponentLink3Description: LCSC Part URL; ComponentLink3URL: https://lcsc.com/product-detail/Multilayer-Ceramic-Capacitors-MLCC---SMD-SMT_PSAProsperity-Dielectrics-PSAProsperity-Dielectrics-FS32X565K500EGG_C5156763.html
footprint CAP-1210 (1210 (3225M) Capacitor)
pins: 1, 2

## FV32N101J202ECG
designator C?  Capacitance: 100pF  (hidden comment: *)
Capacitor, Ceramic (MLCC), 100pF, ±5%, 2kV, ±5%, SMD 1210; Manufacturer: PSA(Prosperity Dielectrics); Manufacturer Part Number: FV32N101J202ECG; Package Size: 1210; JLCPCB Basic Part: No; JLCPCB Part Number: C1021551; Supplier 1: LCSC; Category: Capacitors - MLCC; Supplier Part Number 1: C1021551; Tolerance: ±5%; Voltage Rating: 2kV; RoHS: Yes; ComponentLink1Description: Datasheet; ComponentLink1URL: https://wmsc.lcsc.com/wmsc/upload/file/pdf/v2/lcsc/2304140030_PSA-Prosperity-Dielectrics-FV32N101J202ECG_C1021551.pdf; ComponentLink2Description: JLCPCB Part URL; ComponentLink2URL: https://jlcpcb.com/partdetail/C1021551; ComponentLink3Description: LCSC Part URL; ComponentLink3URL: https://lcsc.com/product-detail/Multilayer-Ceramic-Capacitors-MLCC---SMD-SMT_PSAProsperity-Dielectrics-PSAProsperity-Dielectrics-FV32N101J202ECG_C1021551.html
footprint CAP-1210 (1210 (3225M) Capacitor)
pins: 1, 2

## FV32N102J102EEG
designator C?  Capacitance: 1nF  (hidden comment: *)
Capacitor, Ceramic (MLCC), 1nF, ±5%, 1kV, ±5%, SMD 1210; Manufacturer: PSA(Prosperity Dielectrics); Manufacturer Part Number: FV32N102J102EEG; Package Size: 1210; JLCPCB Basic Part: No; JLCPCB Part Number: C976241; Supplier 1: LCSC; Category: Capacitors - MLCC; Supplier Part Number 1: C976241; Tolerance: ±5%; Voltage Rating: 1kV; RoHS: Yes; ComponentLink1Description: Datasheet; ComponentLink1URL: https://wmsc.lcsc.com/wmsc/upload/file/pdf/v2/lcsc/2012171208_PSA-Prosperity-Dielectrics-FV32N102J102EEG_C976241.pdf; ComponentLink2Description: JLCPCB Part URL; ComponentLink2URL: https://jlcpcb.com/partdetail/C976241; ComponentLink3Description: LCSC Part URL; ComponentLink3URL: https://lcsc.com/product-detail/Multilayer-Ceramic-Capacitors-MLCC---SMD-SMT_PSAProsperity-Dielectrics-PSAProsperity-Dielectrics-FV32N102J102EEG_C976241.html
footprint CAP-1210 (1210 (3225M) Capacitor)
pins: 1, 2

## FV32N102J202EFG
designator C?  Capacitance: 1nF  (hidden comment: *)
Capacitor, Ceramic (MLCC), 1nF, ±5%, 2kV, C0G, ±5%, SMD 1210; Manufacturer: PSA(Prosperity Dielectrics); Manufacturer Part Number: FV32N102J202EFG; Package Size: 1210; JLCPCB Basic Part: No; JLCPCB Part Number: C692314; Supplier 1: LCSC; Category: Capacitors - MLCC; Supplier Part Number 1: C692314; Tolerance: ±5%; Voltage Rating: 2kV; Temperature Coefficient: C0G; RoHS: Yes; ComponentLink1Description: Datasheet; ComponentLink1URL: https://wmsc.lcsc.com/wmsc/upload/file/pdf/v2/lcsc/2304140030_PSA-Prosperity-Dielectrics-FV32N102J202EFG_C692314.pdf; ComponentLink2Description: JLCPCB Part URL; ComponentLink2URL: https://jlcpcb.com/partdetail/C692314; ComponentLink3Description: LCSC Part URL; ComponentLink3URL: https://lcsc.com/product-detail/Multilayer-Ceramic-Capacitors-MLCC---SMD-SMT_PSAProsperity-Dielectrics-PSAProsperity-Dielectrics-FV32N102J202EFG_C692314.html
footprint CAP-1210 (1210 (3225M) Capacitor)
pins: 1, 2

## FV32N221J202EEG
designator C?  Capacitance: 220pF  (hidden comment: *)
Capacitor, Ceramic (MLCC), 220pF, 2kV, C0G, SMD 1210; Manufacturer: PSA(Prosperity Dielectrics); Manufacturer Part Number: FV32N221J202EEG; Package Size: 1210; JLCPCB Basic Part: No; JLCPCB Part Number: C2958813; Supplier 1: LCSC; Category: Capacitors - MLCC; Supplier Part Number 1: C2958813; Voltage Rating: 2kV; Temperature Coefficient: C0G; RoHS: Yes; ComponentLink1Description: Datasheet; ComponentLink1URL: https://wmsc.lcsc.com/wmsc/upload/file/pdf/v2/lcsc/2201201730_PSA-Prosperity-Dielectrics-FV32N221J202EEG_C2958813.pdf; ComponentLink2Description: JLCPCB Part URL; ComponentLink2URL: https://jlcpcb.com/partdetail/C2958813; ComponentLink3Description: LCSC Part URL; ComponentLink3URL: https://lcsc.com/product-detail/Multilayer-Ceramic-Capacitors-MLCC---SMD-SMT_PSAProsperity-Dielectrics-PSAProsperity-Dielectrics-FV32N221J202EEG_C2958813.html
footprint CAP-1210 (1210 (3225M) Capacitor)
pins: 1, 2

## FV32X102K102EEG
designator C?  Capacitance: 1nF  (hidden comment: *)
Capacitor, Ceramic (MLCC), 1nF, ±10%, 1kV, X7R, ±10%, SMD 1210; Manufacturer: PSA(Prosperity Dielectrics); Manufacturer Part Number: FV32X102K102EEG; Package Size: 1210; JLCPCB Basic Part: No; JLCPCB Part Number: C525359; Supplier 1: LCSC; Category: Capacitors - MLCC; Supplier Part Number 1: C525359; Tolerance: ±10%; Voltage Rating: 1kV; Temperature Coefficient: X7R; RoHS: Yes; ComponentLink1Description: Datasheet; ComponentLink1URL: https://wmsc.lcsc.com/wmsc/upload/file/pdf/v2/lcsc/2304140030_PSA-Prosperity-Dielectrics-FV32X102K102EEG_C525359.pdf; ComponentLink2Description: JLCPCB Part URL; ComponentLink2URL: https://jlcpcb.com/partdetail/C525359; ComponentLink3Description: LCSC Part URL; ComponentLink3URL: https://lcsc.com/product-detail/Multilayer-Ceramic-Capacitors-MLCC---SMD-SMT_PSAProsperity-Dielectrics-PSAProsperity-Dielectrics-FV32X102K102EEG_C525359.html
footprint CAP-1210 (1210 (3225M) Capacitor)
pins: 1, 2

## FV32X102K202EEG
designator C?  Capacitance: 1nF  (hidden comment: *)
Capacitor, Ceramic (MLCC), 1nF, ±10%, 2kV, X7R, ±10%, SMD 1210; Manufacturer: PSA(Prosperity Dielectrics); Manufacturer Part Number: FV32X102K202EEG; Package Size: 1210; JLCPCB Basic Part: No; JLCPCB Part Number: C692289; Supplier 1: LCSC; Category: Capacitors - MLCC; Supplier Part Number 1: C692289; Tolerance: ±10%; Voltage Rating: 2kV; Temperature Coefficient: X7R; RoHS: Yes; ComponentLink1Description: Datasheet; ComponentLink1URL: https://wmsc.lcsc.com/wmsc/upload/file/pdf/v2/lcsc/2304140030_PSA-Prosperity-Dielectrics-FV32X102K202EEG_C692289.pdf; ComponentLink2Description: JLCPCB Part URL; ComponentLink2URL: https://jlcpcb.com/partdetail/C692289; ComponentLink3Description: LCSC Part URL; ComponentLink3URL: https://lcsc.com/product-detail/Multilayer-Ceramic-Capacitors-MLCC---SMD-SMT_PSAProsperity-Dielectrics-PSAProsperity-Dielectrics-FV32X102K202EEG_C692289.html
footprint CAP-1210 (1210 (3225M) Capacitor)
pins: 1, 2

## FV32X103K102EEG
designator C?  Capacitance: 10nF  (hidden comment: *)
Capacitor, Ceramic (MLCC), 10nF, ±10%, 1kV, X7R, ±10%, SMD 1210; Manufacturer: PSA(Prosperity Dielectrics); Manufacturer Part Number: FV32X103K102EEG; Package Size: 1210; JLCPCB Basic Part: No; JLCPCB Part Number: C382200; Supplier 1: LCSC; Category: Capacitors - MLCC; Supplier Part Number 1: C382200; Tolerance: ±10%; Voltage Rating: 1kV; Temperature Coefficient: X7R; RoHS: Yes; ComponentLink1Description: Datasheet; ComponentLink1URL: https://wmsc.lcsc.com/wmsc/upload/file/pdf/v2/lcsc/2304140030_PSA-Prosperity-Dielectrics-FV32X103K102EEG_C382200.pdf; ComponentLink2Description: JLCPCB Part URL; ComponentLink2URL: https://jlcpcb.com/partdetail/C382200; ComponentLink3Description: LCSC Part URL; ComponentLink3URL: https://lcsc.com/product-detail/Multilayer-Ceramic-Capacitors-MLCC---SMD-SMT_PSAProsperity-Dielectrics-PSAProsperity-Dielectrics-FV32X103K102EEG_C382200.html
footprint CAP-1210 (1210 (3225M) Capacitor)
pins: 1, 2

## FV32X103K202EGQ
designator C?  Capacitance: 10nF  (hidden comment: *)
Capacitor, Ceramic (MLCC), 10nF, ±10%, 2kV, ±10%, SMD 1210; Manufacturer: PSA(Prosperity Dielectrics); Manufacturer Part Number: FV32X103K202EGQ; Package Size: 1210; JLCPCB Basic Part: No; JLCPCB Part Number: C1021550; Supplier 1: LCSC; Category: Capacitors - MLCC; Supplier Part Number 1: C1021550; Tolerance: ±10%; Voltage Rating: 2kV; RoHS: Yes; ComponentLink1Description: Datasheet; ComponentLink1URL: https://wmsc.lcsc.com/wmsc/upload/file/pdf/v2/lcsc/2304140030_PSA-Prosperity-Dielectrics-FV32X103K202EGQ_C1021550.pdf; ComponentLink2Description: JLCPCB Part URL; ComponentLink2URL: https://jlcpcb.com/partdetail/C1021550; ComponentLink3Description: LCSC Part URL; ComponentLink3URL: https://lcsc.com/product-detail/Multilayer-Ceramic-Capacitors-MLCC---SMD-SMT_PSAProsperity-Dielectrics-PSAProsperity-Dielectrics-FV32X103K202EGQ_C1021550.html
footprint CAP-1210 (1210 (3225M) Capacitor)
pins: 1, 2

## FV32X152K202EFG
designator C?  Capacitance: 1.5nF  (hidden comment: *)
Capacitor, Ceramic (MLCC), 1.5nF, ±10%, 2kV, X7R, ±10%, SMD 1210; Manufacturer: PSA(Prosperity Dielectrics); Manufacturer Part Number: FV32X152K202EFG; Package Size: 1210; JLCPCB Basic Part: No; JLCPCB Part Number: C146196; Supplier 1: LCSC; Category: Capacitors - MLCC; Supplier Part Number 1: C146196; Tolerance: ±10%; Voltage Rating: 2kV; Temperature Coefficient: X7R; RoHS: Yes; ComponentLink1Description: Datasheet; ComponentLink1URL: https://wmsc.lcsc.com/wmsc/upload/file/pdf/v2/lcsc/2304140030_PSA-Prosperity-Dielectrics-FV32X152K202EFG_C146196.pdf; ComponentLink2Description: JLCPCB Part URL; ComponentLink2URL: https://jlcpcb.com/partdetail/C146196; ComponentLink3Description: LCSC Part URL; ComponentLink3URL: https://lcsc.com/product-detail/Multilayer-Ceramic-Capacitors-MLCC---SMD-SMT_PSAProsperity-Dielectrics-PSAProsperity-Dielectrics-FV32X152K202EFG_C146196.html
footprint CAP-1210 (1210 (3225M) Capacitor)
pins: 1, 2

## FV32X153K102EEG
designator C?  Capacitance: 15nF  (hidden comment: *)
Capacitor, Ceramic (MLCC), 15nF, ±10%, 1kV, X7R, ±10%, SMD 1210; Manufacturer: PSA(Prosperity Dielectrics); Manufacturer Part Number: FV32X153K102EEG; Package Size: 1210; JLCPCB Basic Part: No; JLCPCB Part Number: C2915728; Supplier 1: LCSC; Category: Capacitors - MLCC; Supplier Part Number 1: C2915728; Tolerance: ±10%; Voltage Rating: 1kV; Temperature Coefficient: X7R; RoHS: Yes; ComponentLink1Description: Datasheet; ComponentLink1URL: https://wmsc.lcsc.com/wmsc/upload/file/pdf/v2/lcsc/2111161830_PSA-Prosperity-Dielectrics-FV32X153K102EEG_C2915728.pdf; ComponentLink2Description: JLCPCB Part URL; ComponentLink2URL: https://jlcpcb.com/partdetail/C2915728; ComponentLink3Description: LCSC Part URL; ComponentLink3URL: https://lcsc.com/product-detail/Multilayer-Ceramic-Capacitors-MLCC---SMD-SMT_PSAProsperity-Dielectrics-PSAProsperity-Dielectrics-FV32X153K102EEG_C2915728.html
footprint CAP-1210 (1210 (3225M) Capacitor)
pins: 1, 2

## FV32X221K202EEG
designator C?  Capacitance: 220pF  (hidden comment: *)
Capacitor, Ceramic (MLCC), 220pF, ±10%, 2kV, X7R, ±10%, SMD 1210; Manufacturer: PSA(Prosperity Dielectrics); Manufacturer Part Number: FV32X221K202EEG; Package Size: 1210; JLCPCB Basic Part: No; JLCPCB Part Number: C692287; Supplier 1: LCSC; Category: Capacitors - MLCC; Supplier Part Number 1: C692287; Tolerance: ±10%; Voltage Rating: 2kV; Temperature Coefficient: X7R; RoHS: Yes; ComponentLink1Description: Datasheet; ComponentLink1URL: https://wmsc.lcsc.com/wmsc/upload/file/pdf/v2/lcsc/2304140030_PSA-Prosperity-Dielectrics-FV32X221K202EEG_C692287.pdf; ComponentLink2Description: JLCPCB Part URL; ComponentLink2URL: https://jlcpcb.com/partdetail/C692287; ComponentLink3Description: LCSC Part URL; ComponentLink3URL: https://lcsc.com/product-detail/Multilayer-Ceramic-Capacitors-MLCC---SMD-SMT_PSAProsperity-Dielectrics-PSAProsperity-Dielectrics-FV32X221K202EEG_C692287.html
footprint CAP-1210 (1210 (3225M) Capacitor)
pins: 1, 2

## FV32X222K102EEG
designator C?  Capacitance: 2.2nF  (hidden comment: *)
Capacitor, Ceramic (MLCC), 2.2nF, 1kV, X7R, SMD 1210; Manufacturer: PSA(Prosperity Dielectrics); Manufacturer Part Number: FV32X222K102EEG; Package Size: 1210; JLCPCB Basic Part: No; JLCPCB Part Number: C2981484; Supplier 1: LCSC; Category: Capacitors - MLCC; Supplier Part Number 1: C2981484; Voltage Rating: 1kV; Temperature Coefficient: X7R; RoHS: Yes; ComponentLink1Description: Datasheet; ComponentLink1URL: https://wmsc.lcsc.com/wmsc/upload/file/pdf/v2/lcsc/2203101903_PSA-Prosperity-Dielectrics-FV32X222K102EEG_C2981484.pdf; ComponentLink2Description: JLCPCB Part URL; ComponentLink2URL: https://jlcpcb.com/partdetail/C2981484; ComponentLink3Description: LCSC Part URL; ComponentLink3URL: https://lcsc.com/product-detail/Multilayer-Ceramic-Capacitors-MLCC---SMD-SMT_PSAProsperity-Dielectrics-PSAProsperity-Dielectrics-FV32X222K102EEG_C2981484.html
footprint CAP-1210 (1210 (3225M) Capacitor)
pins: 1, 2

## FV32X222K202EFG
designator C?  Capacitance: 2.2nF  (hidden comment: *)
Capacitor, Ceramic (MLCC), 2.2nF, ±10%, 2kV, X7R, ±10%, SMD 1210; Manufacturer: PSA(Prosperity Dielectrics); Manufacturer Part Number: FV32X222K202EFG; Package Size: 1210; JLCPCB Basic Part: No; JLCPCB Part Number: C146197; Supplier 1: LCSC; Category: Capacitors - MLCC; Supplier Part Number 1: C146197; Tolerance: ±10%; Voltage Rating: 2kV; Temperature Coefficient: X7R; RoHS: Yes; ComponentLink1Description: Datasheet; ComponentLink1URL: https://wmsc.lcsc.com/wmsc/upload/file/pdf/v2/lcsc/2304140030_PSA-Prosperity-Dielectrics-FV32X222K202EFG_C146197.pdf; ComponentLink2Description: JLCPCB Part URL; ComponentLink2URL: https://jlcpcb.com/partdetail/C146197; ComponentLink3Description: LCSC Part URL; ComponentLink3URL: https://lcsc.com/product-detail/Multilayer-Ceramic-Capacitors-MLCC---SMD-SMT_PSAProsperity-Dielectrics-PSAProsperity-Dielectrics-FV32X222K202EFG_C146197.html
footprint CAP-1210 (1210 (3225M) Capacitor)
pins: 1, 2
